# Altium footprint library micro-intel.PCBLIB: 48 footprints (part 2 of 4) (continued)
## PBGA492 [mil] (continued)
Top Overlay:
  lines w8: -685.04,-665.35 -685.04,685.04 665.35,685.04 ccw(c685.04,685.04) 685.04,665.35 685.04,-665.35 ccw(c685.04,-685.04) 665.35,-685.04 -665.35,-685.04 ccw(c-685.04,-685.04) -685.04,-665.35
Top Solder:
  drawing of 492 lines, arcs and shapes, not listed
Mechanical 16:
  circle w0: c-468.5,468.5 r19.69
  lines w8: -586.61,-431.1 -431.1,-586.61 431.1,-586.61 586.61,-431.1 586.61,431.1 431.1,586.61 -431.1,586.61 -586.61,431.1 -586.61,-431.1

## PBGA544 [mil]
pads (544):
  rrect100% 31.5x31.5 smd: A1(-625,625) A2(-575,625) A3(-525,625) A4(-475,625) A5(-425,625) A6(-375,625) A7(-325,625) A8(-275,625) A9(-225,625) A10(-175,625) A11(-125,625) A12(-75,625) A13(-25,625) A14(25,625) A15(75,625) A16(125,625) A17(175,625) A18(225,625) A19(275,625) A20(325,625) A21(375,625) A22(425,625) A23(475,625) A24(525,625) A25(575,625) A26(625,625) AA1(-625,-375) AA2(-575,-375) AA3(-525,-375) AA4(-475,-375) AA5(-425,-375) AA6(-375,-375) AA7(-325,-375) AA8(-275,-375) AA9(-225,-375) AA10(-175,-375) AA11(-125,-375) AA12(-75,-375) AA13(-25,-375) AA14(25,-375) AA15(75,-375) AA16(125,-375) AA17(175,-375) AA18(225,-375) AA19(275,-375) AA20(325,-375) AA21(375,-375) AA22(425,-375) AA23(475,-375) AA24(525,-375) AA25(575,-375) AA26(625,-375) AB1(-625,-425) AB2(-575,-425) AB3(-525,-425) AB4(-475,-425) AB5(-425,-425) AB6(-375,-425) AB7(-325,-425) AB8(-275,-425) AB9(-225,-425) AB10(-175,-425) AB11(-125,-425) AB12(-75,-425) AB13(-25,-425) AB14(25,-425) AB15(75,-425) AB16(125,-425) AB17(175,-425) AB18(225,-425) AB19(275,-425) AB20(325,-425) AB21(375,-425) AB22(425,-425) AB23(475,-425) AB24(525,-425) AB25(575,-425) AB26(625,-425) AC1(-625,-475) AC2(-575,-475) AC3(-525,-475) AC4(-475,-475) AC5(-425,-475) AC6(-375,-475) AC7(-325,-475) AC8(-275,-475) AC9(-225,-475) AC10(-175,-475) AC11(-125,-475) AC12(-75,-475) AC13(-25,-475) AC14(25,-475) AC15(75,-475) AC16(125,-475) AC17(175,-475) AC18(225,-475) AC19(275,-475) AC20(325,-475) AC21(375,-475) AC22(425,-475) AC23(475,-475) AC24(525,-475) AC25(575,-475) AC26(625,-475) AD1(-625,-525) AD2(-575,-525) AD3(-525,-525) AD4(-475,-525) AD5(-425,-525) AD6(-375,-525) AD7(-325,-525) AD8(-275,-525) AD9(-225,-525) AD10(-175,-525) AD11(-125,-525) AD12(-75,-525) AD13(-25,-525) AD14(25,-525) AD15(75,-525) AD16(125,-525) AD17(175,-525) AD18(225,-525) AD19(275,-525) AD20(325,-525) AD21(375,-525) AD22(425,-525) AD23(475,-525) AD24(525,-525) AD25(575,-525) AD26(625,-525) AE1(-625,-575) AE2(-575,-575) AE3(-525,-575) AE4(-475,-575) AE5(-425,-575) AE6(-375,-575) AE7(-325,-575) AE8(-275,-575) AE9(-225,-575) AE10(-175,-575) AE11(-125,-575) AE12(-75,-575) AE13(-25,-575) AE14(25,-575) AE15(75,-575) AE16(125,-575) AE17(175,-575) AE18(225,-575) AE19(275,-575) AE20(325,-575) AE21(375,-575) AE22(425,-575) AE23(475,-575) AE24(525,-575) AE25(575,-575) AE26(625,-575) AF1(-625,-625) AF2(-575,-625) AF3(-525,-625) AF4(-475,-625) AF5(-425,-625) AF6(-375,-625) AF7(-325,-625) AF8(-275,-625) AF9(-225,-625) AF10(-175,-625) AF11(-125,-625) AF12(-75,-625) AF13(-25,-625) AF14(25,-625) AF15(75,-625) AF16(125,-625) AF17(175,-625) AF18(225,-625) AF19(275,-625) AF20(325,-625) AF21(375,-625) AF22(425,-625) AF23(475,-625) AF24(525,-625) AF25(575,-625) AF26(625,-625) B1(-625,575) B2(-575,575) B3(-525,575) B4(-475,575) B5(-425,575) B6(-375,575) B7(-325,575) B8(-275,575) B9(-225,575) B10(-175,575) B11(-125,575) B12(-75,575) B13(-25,575) B14(25,575) B15(75,575) B16(125,575) B17(175,575) B18(225,575) B19(275,575) B20(325,575) B21(375,575) B22(425,575) B23(475,575) B24(525,575) B25(575,575) B26(625,575) C1(-625,525) C2(-575,525) C3(-525,525) C4(-475,525) C5(-425,525) C6(-375,525) C7(-325,525) C8(-275,525) C9(-225,525) C10(-175,525) C11(-125,525) C12(-75,525) C13(-25,525) C14(25,525) C15(75,525) C16(125,525) C17(175,525) C18(225,525) C19(275,525) C20(325,525) C21(375,525) C22(425,525) C23(475,525) C24(525,525) C25(575,525) C26(625,525) D1(-625,475) D2(-575,475) D3(-525,475) D4(-475,475) D5(-425,475) D6(-375,475) D7(-325,475) D8(-275,475) D9(-225,475) D10(-175,475) D11(-125,475) D12(-75,475) D13(-25,475) D14(25,475) D15(75,475) D16(125,475) D17(175,475) D18(225,475) D19(275,475) D20(325,475) D21(375,475) D22(425,475) D23(475,475) D24(525,475) D25(575,475) D26(625,475) E1(-625,425) E2(-575,425) E3(-525,425) E4(-475,425) E5(-425,425) E6(-375,425) E7(-325,425) E8(-275,425) E9(-225,425) E10(-175,425) E11(-125,425) E12(-75,425) E13(-25,425) E14(25,425) E15(75,425) E16(125,425) E17(175,425) E18(225,425) E19(275,425) E20(325,425) E21(375,425) E22(425,425) E23(475,425) E24(525,425) E25(575,425) E26(625,425) F1(-625,375) F2(-575,375) F3(-525,375) F4(-475,375) F5(-425,375) F6(-375,375) F7(-325,375) F8(-275,375) F9(-225,375) F10(-175,375) F11(-125,375) F12(-75,375) F13(-25,375) F14(25,375) F15(75,375) F16(125,375) F17(175,375) F18(225,375) F19(275,375) F20(325,375) F21(375,375) F22(425,375) F23(475,375) F24(525,375) F25(575,375) F26(625,375) G1(-625,325) G2(-575,325) G3(-525,325) G4(-475,325) G5(-425,325) G6(-375,325) G7(-325,325) G8(-275,325) G9(-225,325) G10(-175,325) G17(175,325) G18(225,325) G19(275,325) G20(325,325) G21(375,325) G22(425,325) G23(475,325) G24(525,325) G25(575,325) G26(625,325) H1(-625,275) H2(-575,275) H3(-525,275) H4(-475,275) H5(-425,275) H6(-375,275) H7(-325,275) H20(325,275) H21(375,275) H22(425,275) H23(475,275) H24(525,275) H25(575,275) H26(625,275) J1(-625,225) J2(-575,225) J3(-525,225) J4(-475,225) J5(-425,225) J6(-375,225) J7(-325,225) J20(325,225) J21(375,225) J22(425,225) J23(475,225) J24(525,225) J25(575,225) J26(625,225) K1(-625,175) K2(-575,175) K3(-525,175) K4(-475,175) K5(-425,175) K6(-375,175) K7(-325,175) K20(325,175) K21(375,175) K22(425,175) K23(475,175) K24(525,175) K25(575,175) K26(625,175) L1(-625,125) L2(-575,125) L3(-525,125) L4(-475,125) L5(-425,125) L6(-375,125) L11(-125,125) L12(-75,125) L13(-25,125) L14(25,125) L15(75,125) L16(125,125) L21(375,125) L22(425,125) L23(475,125) L24(525,125) L25(575,125) L26(625,125) M1(-625,75) M2(-575,75) M3(-525,75) M4(-475,75) M5(-425,75) M6(-375,75) M11(-125,75) M12(-75,75) M13(-25,75) M14(25,75) M15(75,75) M16(125,75) M21(375,75) M22(425,75) M23(475,75) M24(525,75) M25(575,75) M26(625,75) N1(-625,25) N2(-575,25) N3(-525,25) N4(-475,25) N5(-425,25) N6(-375,25) N11(-125,25) N12(-75,25) N13(-25,25) N14(25,25) N15(75,25) N16(125,25) N21(375,25) N22(425,25) N23(475,25) N24(525,25) N25(575,25) N26(625,25) P1(-625,-25) P2(-575,-25) P3(-525,-25) P4(-475,-25) P5(-425,-25) P6(-375,-25) P11(-125,-25) P12(-75,-25) P13(-25,-25) P14(25,-25) P15(75,-25) P16(125,-25) P21(375,-25) P22(425,-25) P23(475,-25) P24(525,-25) P25(575,-25) P26(625,-25) R1(-625,-75) R2(-575,-75) R3(-525,-75) R4(-475,-75) R5(-425,-75) R6(-375,-75) R11(-125,-75) R12(-75,-75) R13(-25,-75) R14(25,-75) R15(75,-75) R16(125,-75) R21(375,-75) R22(425,-75) R23(475,-75) R24(525,-75) R25(575,-75) R26(625,-75) T1(-625,-125) T2(-575,-125) T3(-525,-125) T4(-475,-125) T5(-425,-125) T6(-375,-125) T11(-125,-125) T12(-75,-125) T13(-25,-125) T14(25,-125) T15(75,-125) T16(125,-125) T21(375,-125) T22(425,-125) T23(475,-125) T24(525,-125) T25(575,-125) T26(625,-125) U1(-625,-175) U2(-575,-175) U3(-525,-175) U4(-475,-175) U5(-425,-175) U6(-375,-175) U7(-325,-175) U20(325,-175) U21(375,-175) U22(425,-175) U23(475,-175) U24(525,-175) U25(575,-175) U26(625,-175) V1(-625,-225) V2(-575,-225) V3(-525,-225) V4(-475,-225) V5(-425,-225) V6(-375,-225) V7(-325,-225) V20(325,-225) V21(375,-225) V22(425,-225) V23(475,-225) V24(525,-225) V25(575,-225) V26(625,-225) W1(-625,-275) W2(-575,-275) W3(-525,-275) W4(-475,-275) W5(-425,-275) W6(-375,-275) W7(-325,-275) W20(325,-275) W21(375,-275) W22(425,-275) W23(475,-275) W24(525,-275) W25(575,-275) W26(625,-275) Y1(-625,-325) Y2(-575,-325) Y3(-525,-325) Y4(-475,-325) Y5(-425,-325) Y6(-375,-325) Y7(-325,-325) Y8(-275,-325) Y9(-225,-325) Y10(-175,-325) Y17(175,-325) Y18(225,-325) Y19(275,-325) Y20(325,-325) Y21(375,-325) Y22(425,-325) Y23(475,-325) Y24(525,-325) Y25(575,-325) Y26(625,-325)
Top Overlay:
  lines w8: -688.91,642.91 -688.91,688.91 -642.91,688.91 ; -688.91,642.91 -688.91,-688.91 688.91,-688.91 688.91,688.91 -642.91,688.91 ; -688.91,642.91 -642.91,688.91
Top Solder:
  drawing of 544 lines, arcs and shapes, not listed

## PGA68 [mil]
pads (68):
  oct 48x48 hole 32: A02(-400,500) A03(-300,500) A04(-200,500) A05(-100,500) A06(0,500) A07(100,500) A08(200,500) A09(300,500) A10(400,500) B01(-500,400) B02(-400,400) B03(-300,400) B04(-200,400) B05(-100,400) B06(0,400) B07(100,400) B08(200,400) B09(300,400) B10(400,400) B11(500,400) C01(-500,300) C02(-400,300) C10(400,300) C11(500,300) D01(-500,200) D02(-400,200) D10(400,200) D11(500,200) E01(-500,100) E02(-400,100) E10(400,100) E11(500,100) F01(-500,0) F02(-400,0) F10(400,0) F11(500,0) G01(-500,-100) G02(-400,-100) G10(400,-100) G11(500,-100) H01(-500,-200) H02(-400,-200) H10(400,-200) H11(500,-200) J01(-500,-300) J02(-400,-300) J10(400,-300) J11(500,-300) K01(-500,-400) K02(-400,-400) K03(-300,-400) K04(-200,-400) K05(-100,-400) K06(0,-400) K07(100,-400) K08(200,-400) K09(300,-400) K10(400,-400) K11(500,-400) L02(-400,-500) L03(-300,-500) L04(-200,-500) L05(-100,-500) L06(0,-500) L07(100,-500) L08(200,-500) L09(300,-500) L10(400,-500)
Top Overlay:
  lines w6: -575,-575 575,-575 575,575 -475,575 -575,475 -575,-575 ; -350,-350 350,-350 350,350 -350,350 -350,-350

## PGA68-N [mil]
pads (68):
  rect 48x48 hole 32: 1(-500,400)
  oct 48x48 hole 32: 2(-400,400) 3(-500,300) 4(-400,300) 5(-500,200) 6(-400,200) 7(-500,100) 8(-400,100) 9(-500,0) 10(-400,0) 11(-500,-100) 12(-400,-100) 13(-500,-200) 14(-400,-200) 15(-500,-300) 16(-400,-300) 17(-500,-400) 18(-400,-500) 19(-400,-400) 20(-300,-500) 21(-300,-400) 22(-200,-500) 23(-200,-400) 24(-100,-500) 25(-100,-400) 26(0,-500) 27(0,-400) 28(100,-500) 29(100,-400) 30(200,-500) 31(200,-400) 32(300,-500) 33(300,-400) 34(400,-500) 35(500,-400) 36(400,-400) 37(500,-300) 38(400,-300) 39(500,-200) 40(400,-200) 41(500,-100) 42(400,-100) 43(500,0) 44(400,0) 45(500,100) 46(400,100) 47(500,200) 48(400,200) 49(500,300) 50(400,300) 51(500,400) 52(400,500) 53(400,400) 54(300,500) 55(300,400) 56(200,500) 57(200,400) 58(100,500) 59(100,400) 60(0,500) 61(0,400) 62(-100,500) 63(-100,400) 64(-200,500) 65(-200,400) 66(-300,500) 67(-300,400) 68(-400,500)
Top Overlay:
  lines w6: -575,-575 575,-575 575,575 -475,575 -575,475 -575,-575 ; -350,-350 -350,350 350,350 350,-350 -350,-350

## PGA88 [mil]
pads (88):
  oct 48x48 hole 32: A01(-600,600) A02(-500,600) A03(-400,600) A04(-300,600) A05(-200,600) A06(-100,600) A07(0,600) A08(100,600) A09(200,600) A10(300,600) A11(400,600) A12(500,600) A13(600,600) B01(-600,500) B02(-500,500) B03(-400,500) B04(-300,500) B05(-200,500) B06(-100,500) B07(0,500) B08(100,500) B09(200,500) B10(300,500) B11(400,500) B12(500,500) B13(600,500) C01(-600,400) C02(-500,400) C12(500,400) C13(600,400) D01(-600,300) D02(-500,300) D12(500,300) D13(600,300) E01(-600,200) E02(-500,200) E12(500,200) E13(600,200) F01(-600,100) F02(-500,100) F12(500,100) F13(600,100) G01(-600,0) G02(-500,0) G12(500,0) G13(600,0) H01(-600,-100) H02(-500,-100) H12(500,-100) H13(600,-100) J01(-600,-200) J02(-500,-200) J12(500,-200) J13(600,-200) K01(-600,-300) K02(-500,-300) K12(500,-300) K13(600,-300) L01(-600,-400) L02(-500,-400) L12(500,-400) L13(600,-400) M01(-600,-500) M02(-500,-500) M03(-400,-500) M04(-300,-500) M05(-200,-500) M06(-100,-500) M07(0,-500) M08(100,-500) M09(200,-500) M10(300,-500) M11(400,-500) M12(500,-500) M13(600,-500) N01(-600,-600) N02(-500,-600) N03(-400,-600) N04(-300,-600) N05(-200,-600) N06(-100,-600) N07(0,-600) N08(100,-600) N09(200,-600) N10(300,-600) N11(400,-600) N12(500,-600) N13(600,-600)
Top Overlay:
  lines w6: -675,-675 675,-675 675,675 -600,675 -675,600 -675,-675 ; -450,-450 450,-450 450,450 -450,450 -450,-450

## PGA132 [mil]
pads (132):
  oct 48x48 hole 32: A01(-650,650) A02(-550,650) A03(-450,650) A04(-350,650) A05(-250,650) A06(-150,650) A07(-50,650) A08(50,650) A09(150,650) A10(250,650) A11(350,650) A12(450,650) A13(550,650) A14(650,650) B01(-650,550) B02(-550,550) B03(-450,550) B04(-350,550) B05(-250,550) B06(-150,550) B07(-50,550) B08(50,550) B09(150,550) B10(250,550) B11(350,550) B12(450,550) B13(550,550) B14(650,550) C01(-650,450) C02(-550,450) C03(-450,450) C04(-350,450) C05(-250,450) C06(-150,450) C07(-50,450) C08(50,450) C09(150,450) C10(250,450) C11(350,450) C12(450,450) C13(550,450) C14(650,450) D01(-650,350) D02(-550,350) D03(-450,350) D12(450,350) D13(550,350) D14(650,350) E01(-650,250) E02(-550,250) E03(-450,250) E12(450,250) E13(550,250) E14(650,250) F01(-650,150) F02(-550,150) F03(-450,150) F12(450,150) F13(550,150) F14(650,150) G01(-650,50) G02(-550,50) G03(-450,50) G12(450,50) G13(550,50) G14(650,50) H01(-650,-50) H02(-550,-50) H03(-450,-50) H12(450,-50) H13(550,-50) H14(650,-50) J01(-650,-150) J02(-550,-150) J03(-450,-150) J12(450,-150) J13(550,-150) J14(650,-150) K01(-650,-250) K02(-550,-250) K03(-450,-250) K12(450,-250) K13(550,-250) K14(650,-250) L01(-650,-350) L02(-550,-350) L03(-450,-350) L12(450,-350) L13(550,-350) L14(650,-350) M01(-650,-450) M02(-550,-450) M03(-450,-450) M04(-350,-450) M05(-250,-450) M06(-150,-450) M07(-50,-450) M08(50,-450) M09(150,-450) M10(250,-450) M11(350,-450) M12(450,-450) M13(550,-450) M14(650,-450) N01(-650,-550) N02(-550,-550) N03(-450,-550) N04(-350,-550) N05(-250,-550) N06(-150,-550) N07(-50,-550) N08(50,-550) N09(150,-550) N10(250,-550) N11(350,-550) N12(450,-550) N13(550,-550) N14(650,-550) P01(-650,-650) P02(-550,-650) P03(-450,-650) P04(-350,-650) P05(-250,-650) P06(-150,-650) P07(-50,-650) P08(50,-650) P09(150,-650) P10(250,-650) P11(350,-650) P12(450,-650) P13(550,-650) P14(650,-650)
Top Overlay:
  lines w6: -725,-725 725,-725 725,725 -675,725 -725,675 -725,-725 ; -400,-400 400,-400 400,400 -250,400 -400,250 -400,-400

## PGA168 [mil]
pads (168):
  oct 48x48 hole 32: A01(-800,800) A02(-700,800) A03(-600,800) A04(-500,800) A05(-400,800) A06(-300,800) A07(-200,800) A08(-100,800) A09(0,800) A10(100,800) A11(200,800) A12(300,800) A13(400,800) A14(500,800) A15(600,800) A16(700,800) A17(800,800) B01(-800,700) B02(-700,700) B03(-600,700) B04(-500,700) B05(-400,700) B06(-300,700) B07(-200,700) B08(-100,700) B09(0,700) B10(100,700) B11(200,700) B12(300,700) B13(400,700) B14(500,700) B15(600,700) B16(700,700) B17(800,700) C01(-800,600) C02(-700,600) C03(-600,600) C04(-500,600) C05(-400,600) C06(-300,600) C07(-200,600) C08(-100,600) C09(0,600) C10(100,600) C11(200,600) C12(300,600) C13(400,600) C14(500,600) C15(600,600) C16(700,600) C17(800,600) D01(-800,500) D02(-700,500) D03(-600,500) D15(600,500) D16(700,500) D17(800,500) E01(-800,400) E02(-700,400) E03(-600,400) E15(600,400) E16(700,400) E17(800,400) F01(-800,300) F02(-700,300) F03(-600,300) F15(600,300) F16(700,300) F17(800,300) G01(-800,200) G02(-700,200) G03(-600,200) G15(600,200) G16(700,200) G17(800,200) H01(-800,100) H02(-700,100) H03(-600,100) H15(600,100) H16(700,100) H17(800,100) J01(-800,0) J02(-700,0) J03(-600,0) J15(600,0) J16(700,0) J17(800,0) K01(-800,-100) K02(-700,-100) K03(-600,-100) K15(600,-100) K16(700,-100) K17(800,-100) L01(-800,-200) L02(-700,-200) L03(-600,-200) L15(600,-200) L16(700,-200) L17(800,-200) M01(-800,-300) M02(-700,-300) M03(-600,-300) M15(600,-300) M16(700,-300) M17(800,-300) N01(-800,-400) N02(-700,-400) N03(-600,-400) N15(600,-400) N16(700,-400) N17(800,-400) P01(-800,-500) P02(-700,-500) P03(-600,-500) P15(600,-500) P16(700,-500) P17(800,-500) Q01(-800,-600) Q02(-700,-600) Q03(-600,-600) Q04(-500,-600) Q05(-400,-600) Q06(-300,-600) Q07(-200,-600) Q08(-100,-600) Q09(0,-600) Q10(100,-600) Q11(200,-600) Q12(300,-600) Q13(400,-600) Q14(500,-600) Q15(600,-600) Q16(700,-600) Q17(800,-600) R01(-800,-700) R02(-700,-700) R03(-600,-700) R04(-500,-700) R05(-400,-700) R06(-300,-700) R07(-200,-700) R08(-100,-700) R09(0,-700) R10(100,-700) R11(200,-700) R12(300,-700) R13(400,-700) R14(500,-700) R15(600,-700) R16(700,-700) R17(800,-700) S01(-800,-800) S02(-700,-800) S03(-600,-800) S04(-500,-800) S05(-400,-800) S06(-300,-800) S07(-200,-800) S08(-100,-800) S09(0,-800) S10(100,-800) S11(200,-800) S12(300,-800) S13(400,-800) S14(500,-800) S15(600,-800) S16(700,-800) S17(800,-800)
Top Overlay:
  lines w6: -875,-875 875,-875 875,875 -825,875 -875,825 -875,-875 ; -550,-550 550,-550 550,550 -550,550 -550,-550

## PLCC44 [mil]
pads (44):
  rect 23.62x86.61 smd: 1(0,318.9) 2(-50,318.9) 3(-100,318.9) 4(-150,318.9) 5(-200,318.9) 6(-250,318.9) 18(-250,-318.9) 19(-200,-318.9) 20(-150,-318.9) 21(-100,-318.9) 22(-50,-318.9) 23(0,-318.9) 24(50,-318.9) 25(100,-318.9) 26(150,-318.9) 27(200,-318.9) 28(250,-318.9) 40(250,318.9) 41(200,318.9) 42(150,318.9) 43(100,318.9) 44(50,318.9)
  rect 86.61x23.62 smd: 7(-318.9,250) 8(-318.9,200) 9(-318.9,150) 10(-318.9,100) 11(-318.9,50) 12(-318.9,0) 13(-318.9,-50) 14(-318.9,-100) 15(-318.9,-150) 16(-318.9,-200) 17(-318.9,-250) 29(318.9,-250) 30(318.9,-200) 31(318.9,-150) 32(318.9,-100) 33(318.9,-50) 34(318.9,0) 35(318.9,50) 36(318.9,100) 37(318.9,150) 38(318.9,200) 39(318.9,250)
Mechanical 6:
  rectangle: -39.37,-39.37 39.37,39.37
Mechanical 16:
  circle w24: c0,299.21 r11.81
  rectangle: -10.24,344.49 10.24,362.2
  rectangle: -60.24,344.49 -39.76,362.2
  rectangle: -110.24,344.49 -89.76,362.2
  rectangle: -160.24,344.49 -139.76,362.2
  rectangle: -210.24,344.49 -189.76,362.2
  rectangle: -260.24,344.49 -239.76,362.2
  rectangle: -362.2,239.76 -344.49,260.24
  rectangle: -362.2,189.76 -344.49,210.24
  rectangle: -362.2,139.76 -344.49,160.24
  rectangle: -362.2,89.76 -344.49,110.24
  rectangle: -362.2,39.76 -344.49,60.24
  rectangle: -362.2,-10.24 -344.49,10.24
  rectangle: -362.2,-60.24 -344.49,-39.76
  rectangle: -362.2,-110.24 -344.49,-89.76
  rectangle: -362.2,-160.24 -344.49,-139.76
  rectangle: -362.2,-210.24 -344.49,-189.76
  rectangle: -362.2,-260.24 -344.49,-239.76
  rectangle: -260.24,-362.2 -239.76,-344.49
  rectangle: -210.24,-362.2 -189.76,-344.49
  rectangle: -160.24,-362.2 -139.76,-344.49
  rectangle: -110.24,-362.2 -89.76,-344.49
  rectangle: -60.24,-362.2 -39.76,-344.49
  rectangle: -10.24,-362.2 10.24,-344.49
  rectangle: 39.76,-362.2 60.24,-344.49
  rectangle: 89.76,-362.2 110.24,-344.49
  rectangle: 139.76,-362.2 160.24,-344.49
  rectangle: 189.76,-362.2 210.24,-344.49
  rectangle: 239.76,-362.2 260.24,-344.49
  rectangle: 344.49,-260.24 362.2,-239.76
  rectangle: 344.49,-210.24 362.2,-189.76
  rectangle: 344.49,-160.24 362.2,-139.76
  rectangle: 344.49,-110.24 362.2,-89.76
  rectangle: 344.49,-60.24 362.2,-39.76
  rectangle: 344.49,-10.24 362.2,10.24
  rectangle: 344.49,39.76 362.2,60.24
  rectangle: 344.49,89.76 362.2,110.24
  rectangle: 344.49,139.76 362.2,160.24
  rectangle: 344.49,189.76 362.2,210.24
  rectangle: 344.49,239.76 362.2,260.24
  rectangle: 239.76,344.49 260.24,362.2
  rectangle: 189.76,344.49 210.24,362.2
  rectangle: 139.76,344.49 160.24,362.2
  rectangle: 89.76,344.49 110.24,362.2
  rectangle: 39.76,344.49 60.24,362.2
  lines w8: -342.52,-342.52 -342.52,254.53 -254.53,342.52 342.52,342.52 342.52,-342.52 -342.52,-342.52
  text "IPC PLCC-44 Suare" at -234.65,168.11 h37.2
Mechanical 27:
  lines w7.87: -389.88,-389.88 389.88,-389.88 389.88,389.88 -389.88,389.88 -389.88,-389.88

## PSOP44L [mil]
pads (44):
  rect 19.69x74.8 smd: 1(-525,-296.06) 2(-475,-296.06) 3(-425,-296.06) 4(-375,-296.06) 5(-325,-296.06) 6(-275,-296.06) 7(-225,-296.06) 8(-175,-296.06) 9(-125,-296.06) 10(-75,-296.06) 11(-25,-296.06) 12(25,-296.06) 13(75,-296.06) 14(125,-296.06) 15(175,-296.06) 16(225,-296.06) 17(275,-296.06) 18(325,-296.06) 19(375,-296.06) 20(425,-296.06) 21(475,-296.06) 22(525,-296.06) 23(525,296.06) 24(475,296.06) 25(425,296.06) 26(375,296.06) 27(325,296.06) 28(275,296.06) 29(225,296.06) 30(175,296.06) 31(125,296.06) 32(75,296.06) 33(25,296.06) 34(-25,296.06) 35(-75,296.06) 36(-125,296.06) 37(-175,296.06) 38(-225,296.06) 39(-275,296.06) 40(-325,296.06) 41(-375,296.06) 42(-425,296.06) 43(-475,296.06) 44(-525,296.06)
Top Overlay:
  circle w8: c-511.81,-206.69 r19.69
Mechanical 16:
  rectangle: -535,-320 -515,-260
  rectangle: -485,-320 -465,-260
  rectangle: -435,-320 -415,-260
  rectangle: -385,-320 -365,-260
  rectangle: -335,-320 -315,-260
  rectangle: -285,-320 -265,-260
  rectangle: -235,-320 -215,-260
  rectangle: -185,-320 -165,-260
  rectangle: -135,-320 -115,-260
  rectangle: -85,-320 -65,-260
  rectangle: -35,-320 -15,-260
  rectangle: 15,-320 35,-260
  rectangle: 65,-320 85,-260
  rectangle: 115,-320 135,-260
  rectangle: 165,-320 185,-260
  rectangle: 215,-320 235,-260
  rectangle: 265,-320 285,-260
  rectangle: 315,-320 335,-260
  rectangle: 365,-320 385,-260
  rectangle: 415,-320 435,-260
  rectangle: 465,-320 485,-260
  rectangle: 515,-320 535,-260
  rectangle: 515,260 535,320
  rectangle: 465,260 485,320
  rectangle: 415,260 435,320
  rectangle: 365,260 385,320
  rectangle: 315,260 335,320
  rectangle: 265,260 285,320
  rectangle: 215,260 235,320
  rectangle: 165,260 185,320
  rectangle: 115,260 135,320
  rectangle: 65,260 85,320
  rectangle: 15,260 35,320
  rectangle: -35,260 -15,320
  rectangle: -85,260 -65,320
  rectangle: -135,260 -115,320
  rectangle: -185,260 -165,320
  rectangle: -235,260 -215,320
  rectangle: -285,260 -265,320
  rectangle: -335,260 -315,320
  rectangle: -385,260 -365,320
  rectangle: -435,260 -415,320
  rectangle: -485,260 -465,320
  rectangle: -535,260 -515,320
  lines w8: -555.12,-259.84 -555.12,259.84 555.12,259.84 555.12,-259.84 -555.12,-259.84

## QFP44 [mm]
pads (44):
  rect 2.2x0.35 smd: 1(-6.1,4) 2(-6.1,3.2) 3(-6.1,2.4) 4(-6.1,1.6) 5(-6.1,0.8) 6(-6.1,0) 7(-6.1,-0.8) 8(-6.1,-1.6) 9(-6.1,-2.4) 10(-6.1,-3.2) 11(-6.1,-4) 23(6.1,-4) 24(6.1,-3.2) 25(6.1,-2.4) 26(6.1,-1.6) 27(6.1,-0.8) 28(6.1,0) 29(6.1,0.8) 30(6.1,1.6) 31(6.1,2.4) 32(6.1,3.2) 33(6.1,4)
  rect 0.35x2.2 smd: 12(-4,-6.1) 13(-3.2,-6.1) 14(-2.4,-6.1) 15(-1.6,-6.1) 16(-0.8,-6.1) 17(0,-6.1) 18(0.8,-6.1) 19(1.6,-6.1) 20(2.4,-6.1) 21(3.2,-6.1) 22(4,-6.1) 34(4,6.1) 35(3.2,6.1) 36(2.4,6.1) 37(1.6,6.1) 38(0.8,6.1) 39(0,6.1) 40(-0.8,6.1) 41(-1.6,6.1) 42(-2.4,6.1) 43(-3.2,6.1) 44(-4,6.1)
Top Overlay:
  circle w0.152: c-3.5,3.5 r0.5
  lines w0.152: -4.873,-4.373 -4.873,4.373 -4.373,4.873 4.373,4.873 4.873,4.373 4.873,-4.373 4.373,-4.873 -4.373,-4.873 -4.873,-4.373
Mechanical 16:
  rectangle: 4.873,3.825 6.473,4.175
  rectangle: 4.873,3.025 6.473,3.375
  rectangle: 4.873,2.225 6.473,2.575
  rectangle: 4.873,1.425 6.473,1.775
  rectangle: 4.873,0.625 6.473,0.975
  rectangle: 4.873,-0.175 6.473,0.175
  rectangle: 4.873,-0.975 6.473,-0.625
  rectangle: 4.873,-1.775 6.473,-1.425
  rectangle: 4.873,-2.575 6.473,-2.225
  rectangle: 4.873,-3.375 6.473,-3.025
  rectangle: 4.873,-4.175 6.473,-3.825
  rectangle: 3.025,-6.473 3.375,-4.873
  rectangle: 3.825,-6.473 4.175,-4.873
  rectangle: 2.225,-6.473 2.575,-4.873
  rectangle: 1.425,-6.473 1.775,-4.873
  rectangle: 0.625,-6.473 0.975,-4.873
  rectangle: -0.175,-6.473 0.175,-4.873
  rectangle: -0.975,-6.473 -0.625,-4.873
  rectangle: -1.775,-6.473 -1.425,-4.873
  rectangle: -2.575,-6.473 -2.225,-4.873
  rectangle: -3.375,-6.473 -3.025,-4.873
  rectangle: -4.175,-6.473 -3.825,-4.873
  rectangle: -6.473,-4.175 -4.873,-3.825
  rectangle: -6.473,-3.375 -4.873,-3.025
  rectangle: -6.473,-2.575 -4.873,-2.225
  rectangle: -6.473,-1.775 -4.873,-1.425
  rectangle: -6.473,-0.975 -4.873,-0.625
  rectangle: -6.473,-0.175 -4.873,0.175
  rectangle: -6.473,0.625 -4.873,0.975
  rectangle: -6.473,1.425 -4.848,1.775
  rectangle: -6.473,2.225 -4.873,2.575
  rectangle: -6.473,3.025 -4.873,3.375
  rectangle: -6.473,3.825 -4.873,4.175
  rectangle: -4.175,4.873 -3.825,6.473
  rectangle: -3.375,4.873 -3.025,6.473
  rectangle: -2.575,4.873 -2.225,6.473
  rectangle: -0.975,4.873 -0.625,6.473
  rectangle: -1.775,4.873 -1.425,6.473
  rectangle: 0.625,4.873 0.975,6.473
  rectangle: -0.175,4.873 0.175,6.473
  rectangle: 2.225,4.873 2.575,6.473
  rectangle: 1.425,4.873 1.775,6.473
  rectangle: 3.825,4.873 4.175,6.473
  rectangle: 3.025,4.873 3.375,6.473